# Altium schematic symbol library BARKO_SCHLIB.SchLib: 1064 symbols (part 1 of 11) (continued)
## C-100uF-100V (continued)
CAP ALUM 100UF 20% 100V SMD; Manufacturer: United Chemi-Con; Manufacturer Part Number: EMVY101ARA101MKE0S; Dielectric Material: Aluminium; Ripple Current: 450mA; Impedance: 330mR; Life (Hours): 5000Hour; Supplier 1: Digi-Key; Supplier Part Number 1: 565-2511-1-ND; Stock: 2422; Pricing: 1=1.38, 10=1.092, 50=0.9464, 100=0.819 (USD); RoHS: Yes; Mount: Surface Mount; Min Operating Temperature: -40°C; Max Operating Temperature: 105°C; Packaging: Tape and Reel; Ripple Current (AC): 450mA; ESR (Equivalent Series Resistance): 330mR; Termination: SMD/SMT; Package Quantity: 200; Capacitance: 100uF; Voltage Rating: 100V; Tolerance: 20%; Diameter: 12.5mm; Length: 0.53inch; Height: 13.5mm; Height - Seated (Max): 0.531inch; Width: 13mm; REACH SVHC: Unknown; Lead Free: Lead Free; ComponentLink1URL: https://datasheet.ciiva.com/98/mvyseries-98706.pdf?src-supplier=Digi-Key; ComponentLink1Description: https://datasheet.ciiva.com/98/mvyseries-98706.pdf?src-supplier=Digi-Key; ComponentLink2URL: https://datasheet.ciiva.com/98/mvyseries-98707.pdf?src-supplier=Digi-Key; ComponentLink2Description: https://datasheet.ciiva.com/98/mvyseries-98707.pdf?src-supplier=Digi-Key; ComponentLink3URL: https://datasheet.ciiva.com/98/mvyseries-98708.pdf?src-supplier=Digi-Key; ComponentLink3Description: https://datasheet.ciiva.com/98/mvyseries-98708.pdf?src-supplier=Digi-Key; ComponentLink4URL: https://datasheet.ciiva.com/7788/1514044-7788445.pdf?src-supplier=Element14; ComponentLink4Description: https://datasheet.ciiva.com/7788/1514044-7788445.pdf?src-supplier=Element14
footprint C-E-12.5x13.5
pins: 1, 2
text: +

## C-100UF-2917
designator C?, comment 100UF  Voltage Rating: 16V  Case/Package: 2917
CAP TANT 100UF 16V 10% 2917; Manufacturer: Kyocera AVX; Manufacturer Part Number: TPSD107K016R0125; Dielectric Material: Tantalum; ESR (Equivalent Series Resistance): 125mR; Ripple Current: 438uA; Leakage Current: 16uA; Polarity: Polar; Dissipation Factor: 6%; Approvals: IEC; .PCBCHK: CHECKED; .Creator: M.OZKAN; Washability: OK; Supplier 1: Digi-Key; Supplier Part Number 1: 478-1778-6-ND; Stock 1: 120362; Pricing 1: 1=1.12, 10=0.888, 100=0.6656 (USD); Mount: PCB,Surface Mount; Case Code (Metric): 7343; Case Code (Imperial): 2917; Min Operating Temperature: -55°C; Max Operating Temperature: 125°C; Capacitance: 100uF; Tolerance: 10%; Packaging: Tape and Reel; Voltage Rating (DC): 16V; Package Quantity: 1; Termination: SMD/SMT; Voltage: 16V; Features: General Purpose; Length: 7.3mm; Height: 2.9mm; Width: 0.169inch; Height - Seated (Max): 0.122inch; Depth: 4.3mm; Lead Pitch: 4.4mm; Radiation Hardening: No; REACH SVHC: No SVHC; Lead Free: Lead Free; ComponentLink1URL: http://www.jameco.com/Jameco/Products/ProdDS/2028533.pdf; ComponentLink1Description: http://www.jameco.com/Jameco/Products/ProdDS/2028533.pdf; ComponentLink2URL: http://www.avx.com/docs/catalogs/tps.pdf; ComponentLink2Description: http://www.avx.com/docs/catalogs/tps.pdf; ComponentLink3URL: http://global.kyocera.com/prdct/electro/pdf/capacitors/taj-ce.pdf; ComponentLink3Description: http://global.kyocera.com/prdct/electro/pdf/capacitors/taj-ce.pdf; ComponentLink4URL: https://www.alliedelec.com/m/d/83cf44e04b230909adf636c7cda0f956.pdf; ComponentLink4Description: https://www.alliedelec.com/m/d/83cf44e04b230909adf636c7cda0f956.pdf; ComponentLink5URL: http://datasheets.avx.com/TPS.pdf; ComponentLink5Description: http://datasheets.avx.com/TPS.pdf; ComponentLink6URL: http://www.mouser.com/ds/2/40/tps-776850.pdf; ComponentLink6Description: http://www.mouser.com/ds/2/40/tps-776850.pdf; ComponentLink7URL: http://www.avxcorp.com/docs/Catalogs/tps.pdf; ComponentLink7Description: http://www.avxcorp.com/docs/Catalogs/tps.pdf; Supplier 2: Digi-Key; Supplier Part Number 2: 718-1102-6-ND; Stock 2: 6782; Pricing 2: 1=1.04, 10=0.822, 100=0.6167 (USD); Number of Pins: 2; Weight: 0.023634oz; ComponentLink8URL: http://www.vishay.com/docs/40005/593d.pdf; ComponentLink8Description: http://www.vishay.com/docs/40005/593d.pdf; ComponentLink9URL: http://documents.rs-components.com/techlib://itc_doclist_GB.htm?stockno=6844477; ComponentLink9Description: http://documents.rs-components.com/techlib://itc_doclist_GB.htm?stockno=6844477; ComponentLink10URL: http://www.mouser.com/ds/2/427/593d-239975.pdf; ComponentLink10Description: http://www.mouser.com/ds/2/427/593d-239975.pdf; ComponentLink11URL: https://www.alliedelec.com/m/d/4999163682384315a74ef22064734d6b.pdf; ComponentLink11Description: https://www.alliedelec.com/m/d/4999163682384315a74ef22064734d6b.pdf; Supplier 3: Digi-Key; Supplier Part Number 3: 478-9140-6-ND; Stock 3: 20252; Pricing 3: 1=1.38, 10=1.087, 100=0.8151 (USD); ComponentLink12URL: https://www.distrelec.biz/Web/Downloads/_e/ng/tps_ENG.pdf?mime=application%2Fpdf; ComponentLink12Description: https://www.distrelec.biz/Web/Downloads/_e/ng/tps_ENG.pdf?mime=application%2Fpdf; ComponentLink13URL: http://uk.rs-online.com/webdocs/0df8/0900766b80df8ba2.pdf; ComponentLink13Description: http://uk.rs-online.com/webdocs/0df8/0900766b80df8ba2.pdf; ComponentLink14URL: http://www.farnell.com/datasheets/1680477.pdf; ComponentLink14Description: http://www.farnell.com/datasheets/1680477.pdf; ComponentLink15URL: http://www.produktinfo.conrad.com/datenblaetter/800000-824999/806604-da-01-en-SMD_TANTAL100UF_16V_10__0_100R_500ST.pdf; ComponentLink15Description: http://www.produktinfo.conrad.com/datenblaetter/800000-824999/806604-da-01-en-SMD_TANTAL100UF_16V_10__0_100R_500ST.pdf; .SCHCHK: CHECKED
footprint C-TANTD-7343
footprint C-TANTD-7343
pins: 1, 2
text: +

## C-100UF-RADIAL TH_1
designator C?, comment 100UF  Voltage Rating: 63V  Case/Package: Radial
CAP ALUM 100UF 63V 20% RADIAL; Manufacturer: Nichicon; Manufacturer Part Number: UVR1J101MPD; Dielectric Material: Aluminium; Ripple Current: 300mA; Leakage Current: 189uA; Life (Hours): 2000Hour; Dissipation Factor: 0.1%; Lead Diameter: 0.6mm; ESR (Equivalent Series Resistance): 460mR; Impedance: 256mR; Polarity: Polar; Lead/Base Style: Straight; .PCBCHK: CHECKED; .Creator: M.OZKAN; Washability: OK; Supplier 1: Digi-Key; Supplier Part Number 1: 493-1124-ND; Stock 1: 22422; Pricing 1: 1=0.38, 10=0.264, 100=0.1581, 500=0.1186, 1000=0.10015, 2500=0.09488, 5000=0.08961 (USD); Mount: PCB,Through Hole; Number of Pins: 2; Min Operating Temperature: -40°C; Max Operating Temperature: 85°C; Capacitance: 100uF; Tolerance: 20%; Package Quantity: 200; Packaging: Bulk; Voltage Rating (DC): 63V; Termination: Radial; Voltage: 63V; Features: General Purpose; Diameter: 10mm; Length: 12.5mm; Height: 12.5mm; Lead Pitch: 5mm; Height - Seated (Max): 0.394inch; Radiation Hardening: No; REACH SVHC: No SVHC; Lead Free: Lead Free; ComponentLink1URL: https://www.verical.com/server-webapp/html/getDatasheet?partID=54724; ComponentLink1Description: https://www.verical.com/server-webapp/html/getDatasheet?partID=54724; ComponentLink2URL: http://www.nichicon.co.jp/english/products/pdfs/e-vr.pdf; ComponentLink2Description: http://www.nichicon.co.jp/english/products/pdfs/e-vr.pdf; ComponentLink3URL: http://nichicon-us.com/english/products/pdfs/e-mi_tape.pdf; ComponentLink3Description: http://nichicon-us.com/english/products/pdfs/e-mi_tape.pdf; ComponentLink4URL: http://products.nichicon.co.jp/en/pdf/XJA043/e-vr.pdf; ComponentLink4Description: http://products.nichicon.co.jp/en/pdf/XJA043/e-vr.pdf; ComponentLink5URL: http://www.alliedelec.com/m/d/2079ee50b23aa24d1fe62a3e164465c7.pdf; ComponentLink5Description: http://www.alliedelec.com/m/d/2079ee50b23aa24d1fe62a3e164465c7.pdf; ComponentLink6URL: http://www.mouser.com/ds/2/293/e-uvz-880014.pdf; ComponentLink6Description: http://www.mouser.com/ds/2/293/e-uvz-880014.pdf; ComponentLink7URL: http://www.nichicon.co.jp/english/products/pdfs/e-vz.pdf; ComponentLink7Description: http://www.nichicon.co.jp/english/products/pdfs/e-vz.pdf; ComponentLink8URL: http://www.alliedelec.com/m/d/825fa8fc1ff7f2c7f22f565ab2398abe.pdf; ComponentLink8Description: http://www.alliedelec.com/m/d/825fa8fc1ff7f2c7f22f565ab2398abe.pdf; ComponentLink9URL: http://nichicon-us.com/english/products/pdfs/e-uvz.pdf; ComponentLink9Description: http://nichicon-us.com/english/products/pdfs/e-uvz.pdf; Supplier 2: Digi-Key; Supplier Part Number 2: 493-1936-ND; Stock 2: 17120; Pricing 2: 1=0.45, 10=0.317, 100=0.2085, 500=0.15442, 1000=0.13125, 2500=0.12353, 5000=0.11581 (USD); ComponentLink10URL: http://www.mouser.com/ds/2/293/e-upw-883815.pdf; ComponentLink10Description: http://www.mouser.com/ds/2/293/e-upw-883815.pdf; ComponentLink11URL: http://www.nichicon.co.jp/english/products/pdfs/e-pw.pdf; ComponentLink11Description: http://www.nichicon.co.jp/english/products/pdfs/e-pw.pdf; ComponentLink12URL: http://uk.rs-online.com/webdocs/0ec9/0900766b80ec9186.pdf; ComponentLink12Description: http://uk.rs-online.com/webdocs/0ec9/0900766b80ec9186.pdf; ComponentLink13URL: http://www.alliedelec.com/m/d/6537666b9e71158eceac60ee1d77586f.pdf; ComponentLink13Description: http://www.alliedelec.com/m/d/6537666b9e71158eceac60ee1d77586f.pdf; ComponentLink14URL: https://www.verical.com/server-webapp/html/getDatasheet?partID=497226; ComponentLink14Description: https://www.verical.com/server-webapp/html/getDatasheet?partID=497226; ComponentLink15URL: http://www.produktinfo.conrad.com/datenblaetter/425000-449999/444542-da-01-en-RADIAL_ELKO_PW_100UF_63_V.pdf; ComponentLink15Description: http://www.produktinfo.conrad.com/datenblaetter/425000-449999/444542-da-01-en-RADIAL_ELKO_PW_100UF_63_V.pdf; Supplier 3: Digi-Key; Supplier Part Number 3: 718-2234-ND; Stock 3: 580; Pricing 3: 1=0.76, 10=0.538, 100=0.3544, 500=0.2625, 1000=0.22313, 2500=0.21, 5000=0.19688 (USD); ComponentLink16URL: http://www.farnell.com/datasheets/716566.pdf; ComponentLink16Description: http://www.farnell.com/datasheets/716566.pdf; .SCHCHK: CHECKED
pins: 1, 2
text: +

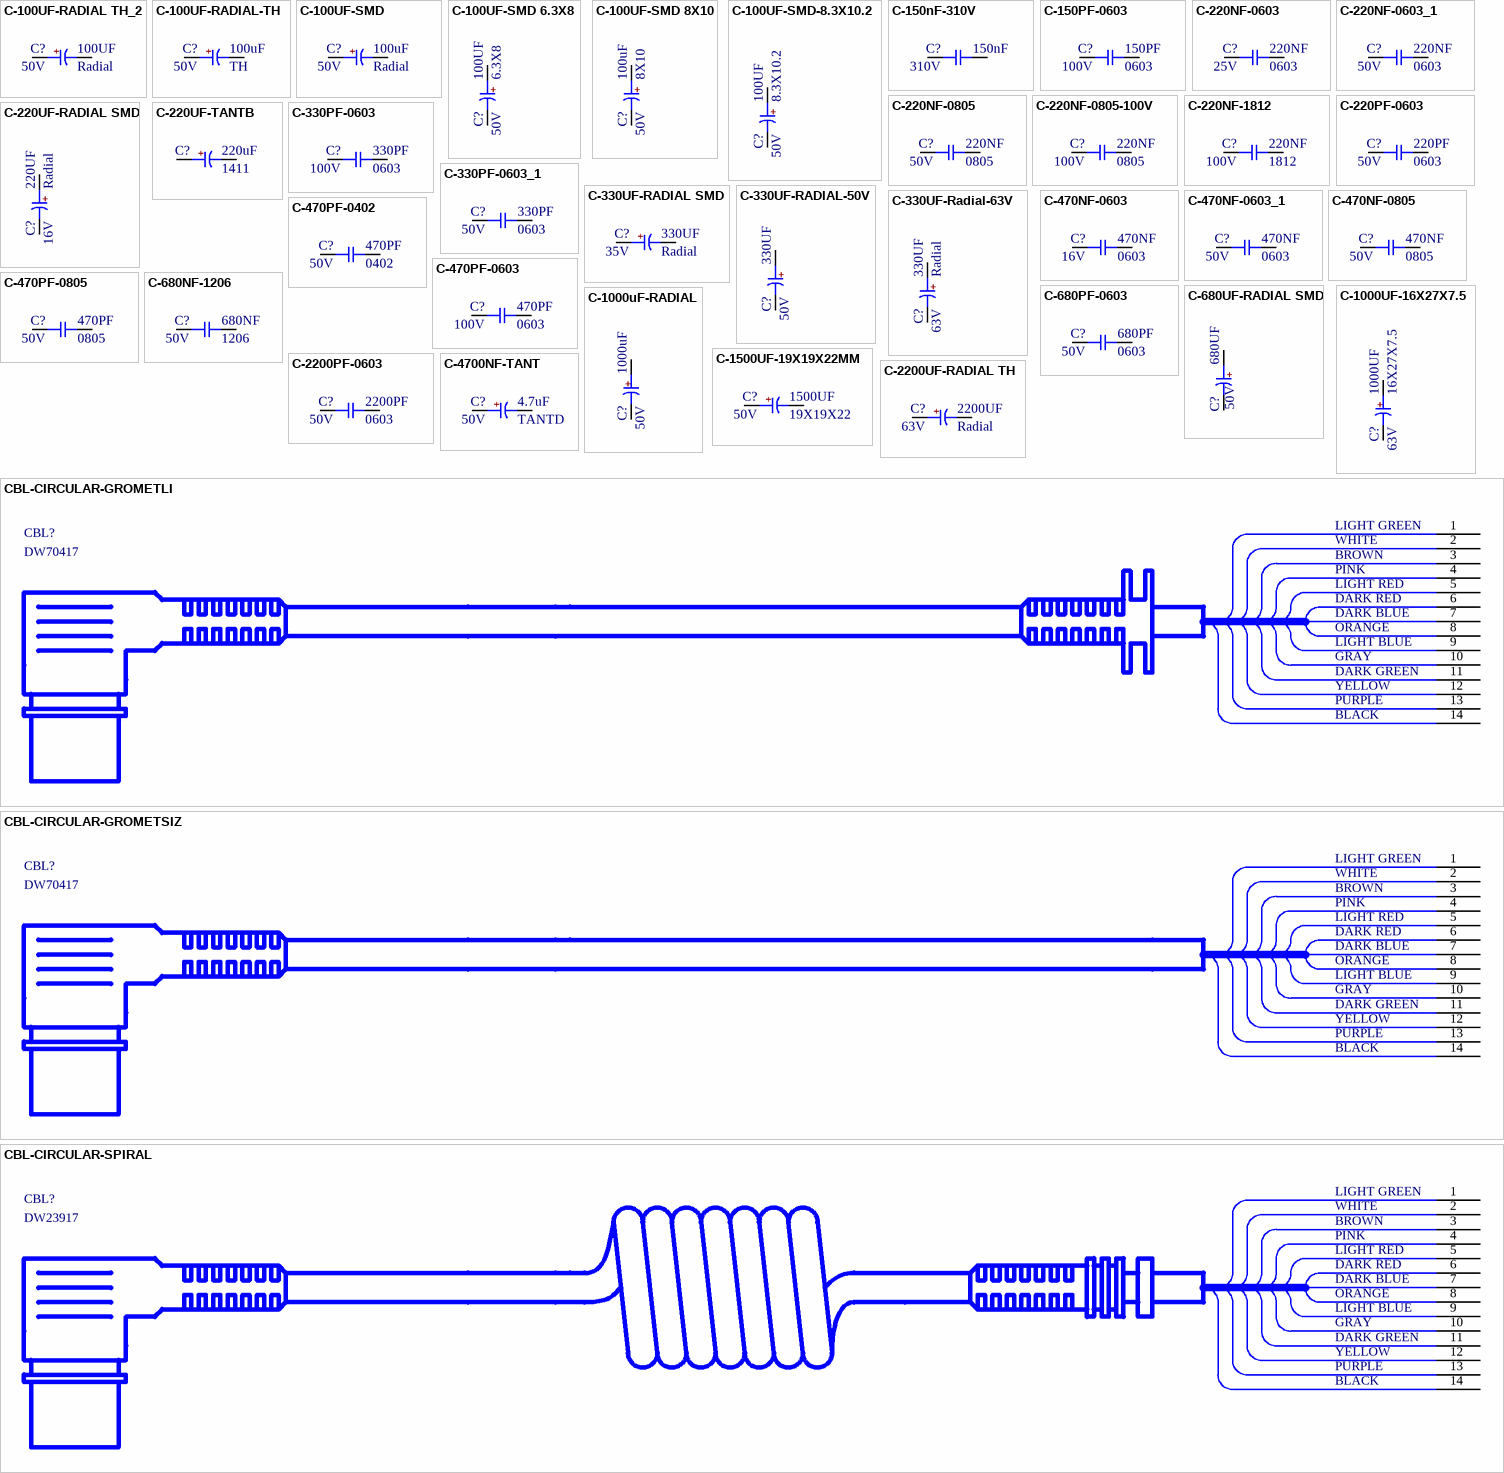
[diagram p3: symbols C-100UF-RADIAL TH_2 to CBL-CIRCULAR-SPIRAL]

## C-100UF-RADIAL TH_2
designator C?, comment 100UF  Voltage Rating: 50V  Case/Package: Radial
CAP ALUM 100UF 20% 50V RADIAL; Manufacturer: Panasonic; Manufacturer Part Number: EEU-FM1H101B; Ripple Current: 870mA; Impedance: 61mR; Life (Hours): 3000Hour; Polarity: Polar; Dissipation Factor: 0.1%; Lead/Base Style: Straight; Lead Diameter: 0.6mm; Dielectric Material: Aluminium; Leakage Current: 150uA; .PCBCHK: CHECKED; .Creator: M.OZKAN; Washability: OK; Supplier 1: Digi-Key; Supplier Part Number 1: P19712CT-ND; Stock 1: 7813; Pricing 1: 1=0.51, 10=0.356, 100=0.2137, 500=0.1603 (USD); Mount: PCB,Through Hole; Min Operating Temperature: -40°C; Max Operating Temperature: 105°C; Capacitance: 100uF; Tolerance: 20%; Packaging: Tape and Reel; Package Quantity: 1000; Voltage Rating (DC): 50V; ESR (Equivalent Series Resistance): 61mR; Termination: Radial; Diameter: 8mm; Length: 11.5mm; Height: 11.5mm; Lead Pitch: 5mm; Height - Seated (Max): 0.512inch; Radiation Hardening: No; REACH SVHC: No SVHC; Lead Free: Lead Free; ComponentLink1URL: https://www.alliedelec.com/m/d/fdd897f5b67d9afc9e8599215884f1a0.pdf; ComponentLink1Description: https://www.alliedelec.com/m/d/fdd897f5b67d9afc9e8599215884f1a0.pdf; ComponentLink2URL: http://www.farnell.com/datasheets/1971458.pdf; ComponentLink2Description: http://www.farnell.com/datasheets/1971458.pdf; ComponentLink3URL: http://www.farnell.com/datasheets/1678946.pdf; ComponentLink3Description: http://www.farnell.com/datasheets/1678946.pdf; ComponentLink4URL: http://industrial.panasonic.com/www-data/pdf/ABA0000/ABA0000CE108.pdf; ComponentLink4Description: http://industrial.panasonic.com/www-data/pdf/ABA0000/ABA0000CE108.pdf; Supplier 2: Digi-Key; Supplier Part Number 2: P19713TB-ND; Stock 2: 1000; Pricing 2: 1000=0.11771, 2000=0.11151, 5000=0.10532, 10000=0.09912, 25000=0.09293, 50000=0.08673, 100000=0.08054 (USD); Features: General Purpose; Supplier 3: Digi-Key; Supplier Part Number 3: 493-13464-1-ND; Stock 3: 54331; Pricing 3: 1=0.36, 10=0.251, 100=0.1507, 500=0.11302 (USD); Number of Pins: 2; ComponentLink5URL: http://nichicon-us.com/english/products/pdfs/e-mi_tape.pdf; ComponentLink5Description: http://nichicon-us.com/english/products/pdfs/e-mi_tape.pdf; ComponentLink6URL: http://www.alliedelec.com/m/d/825fa8fc1ff7f2c7f22f565ab2398abe.pdf; ComponentLink6Description: http://www.alliedelec.com/m/d/825fa8fc1ff7f2c7f22f565ab2398abe.pdf; ComponentLink7URL: http://www.farnell.com/datasheets/1909357.pdf; ComponentLink7Description: http://www.farnell.com/datasheets/1909357.pdf; ComponentLink8URL: http://nichicon-us.com/english/products/pdfs/e-vz.pdf; ComponentLink8Description: http://nichicon-us.com/english/products/pdfs/e-vz.pdf; Voltage: 50V; .SCHCHK: CHECKED
footprint THT_8x13x3.5
pins: 1, 2
text: +

## C-100UF-RADIAL-TH
designator C?, comment Voltage Rating (DC): 50V  Mount: TH  (hidden comment: 100UF)
CAP ALUM 100UF 20% 50V RADIAL; Manufacturer: Nichicon; Manufacturer Part Number: UVR1H101MPD1TA; Dielectric Material: Aluminium; Ripple Current: 260mA; Leakage Current: 150uA; Life (Hours): 2000Hour; Dissipation Factor: 0.12%; Lead Diameter: 0.6mm; .PCBCHK: CHECKED; .Creator: M.OZKAN; Washability: OK; Supplier 1: Digi-Key; Stock 1: 12000; Pricing 1: 1000=0.07519, 2000=0.07161, 5000=0.06624, 10000=0.06266, 25000=0.05729, 50000=0.05371, 100000=0.04744 (USD); Case/Package: Radial; Number of Pins: 2; Min Operating Temperature: -40°C; Max Operating Temperature: 85°C; Package Quantity: 1000; Voltage Rating: 50V; Tolerance: 20%; Packaging: Tape and Reel; Termination: Radial; Diameter: 8mm; Length: 11.5mm; Height: 11.5mm; Lead Pitch: 5mm; Height - Seated (Max): 0.453inch; Radiation Hardening: No; REACH SVHC: No SVHC; Lead Free: Lead Free; ComponentLink1URL: http://nichicon-us.com/english/products/pdfs/e-mi_tape.pdf; ComponentLink1Description: http://nichicon-us.com/english/products/pdfs/e-mi_tape.pdf; ComponentLink2URL: https://www.verical.com/server-webapp/html/getDatasheet?partID=54730; ComponentLink2Description: https://www.verical.com/server-webapp/html/getDatasheet?partID=54730; ComponentLink3URL: http://products.nichicon.co.jp/en/pdf/XJA043/e-vr.pdf; ComponentLink3Description: http://products.nichicon.co.jp/en/pdf/XJA043/e-vr.pdf; Supplier Part Number 1: UVR1H101MPD1TA-ND; Supplier 2: Digi-Key; Supplier Part Number 2: 515D107M050BB6AE3-ND; .SCHCHK: CHECKED; Capacitance: 100uF
footprint C-RADİAL-8X11.5X5
pins: 1, 2
text: +

## C-100UF-SMD
designator C?, comment Case/Package: Radial  Voltage Rating (DC): 50V  (hidden comment: 100UF)
CAP ALUM 100UF 20% 50V SMD; Manufacturer: Nichicon; Manufacturer Part Number: UUD1H101MNL1GS; Dielectric Material: Aluminium; Ripple Current: 300mA; Life (Hours): 5000Hour; Impedance: 340mR; Leakage Current: 3uA; Dissipation Factor: 0.14%; Lead Diameter: 1.1mm; .PCBCHK: CHECKED; .Creator: M.OZKAN; Washability: OK; Supplier 1: Digi-Key; Stock 1: 72155; Pricing 1: 1=0.75, 10=0.554, 100=0.3796 (USD); Number of Pins: 2; Min Operating Temperature: -55°C; Max Operating Temperature: 105°C; Tolerance: 20%; Ripple Current (AC): 300mA; Package Quantity: 500; Packaging: Tape and Reel; Voltage Rating: 50V; Termination: SMD/SMT; Voltage: 50V; Diameter: 8mm; Length: 10mm; Height: 10mm; Lead Pitch: 3.1mm; Height - Seated (Max): 0.394inch; Radiation Hardening: No; REACH SVHC: No SVHC; Lead Free: Lead Free; ComponentLink1URL: http://www.farnell.com/datasheets/2100017.pdf; ComponentLink1Description: http://www.farnell.com/datasheets/2100017.pdf; ComponentLink2URL: http://nichicon-us.com/english/products/pdfs/e-uud.pdf; ComponentLink2Description: http://nichicon-us.com/english/products/pdfs/e-uud.pdf; ComponentLink3URL: http://www.nichicon.co.jp/english/products/pdfs/e-ch_ref.pdf; ComponentLink3Description: http://www.nichicon.co.jp/english/products/pdfs/e-ch_ref.pdf; ComponentLink4URL: http://nichicon-us.com/english/products/pdfs/e-ud.pdf; ComponentLink4Description: http://nichicon-us.com/english/products/pdfs/e-ud.pdf; ComponentLink5URL: http://www.farnell.com/datasheets/1910936.pdf; ComponentLink5Description: http://www.farnell.com/datasheets/1910936.pdf; ComponentLink6URL: http://www.farnell.com/datasheets/66055.pdf; ComponentLink6Description: http://www.farnell.com/datasheets/66055.pdf; ComponentLink7URL: http://uk.rs-online.com/webdocs/0fa3/0900766b80fa39e7.pdf; ComponentLink7Description: http://uk.rs-online.com/webdocs/0fa3/0900766b80fa39e7.pdf; ComponentLink8URL: http://www.nichicon.co.jp/english/products/pdfs/e-ud.pdf; ComponentLink8Description: http://www.nichicon.co.jp/english/products/pdfs/e-ud.pdf; Supplier Part Number 1: 493-2306-6-ND; Supplier 2: Digi-Key; Supplier Part Number 2: 565-2495-6-ND; .SCHCHK: CHECKED; Capacitance: 100uF
pins: 1, 2
text: +

## C-100UF-SMD 6.3X8
designator C?, comment 100UF  Case/Package: 6.3X8  Voltage Rating: 50V
CAP ALUM 100UF 20% 50V SMD; Manufacturer: Panasonic; Manufacturer Part Number: EEE-FTH101XAP; Ripple Current (AC): 350mA; ESR (Equivalent Series Resistance): 340mR; Life (Hours): 2000Hour; Leakage Current: 50uA; Lead Diameter: 0.65mm; Dielectric Material: Aluminium; Dissipation Factor: 0.14%; Polarity: Polar; .PCBCHK: CHECKED; .Creator: M.OZKAN; Washability: OK; Supplier 1: Digi-Key; Supplier Part Number 1: PCE5024DKR-ND; Stock 1: 119228; Pricing 1: 1=0.8, 10=0.591, 100=0.4051 (USD); Mount: PCB,Surface Mount; Number of Pins: 2; Contact Plating: Tin; Min Operating Temperature: -55°C; Max Operating Temperature: 105°C; Packaging: Tape and Reel; Capacitance: 100uF; Tolerance: 20%; Ripple Current: 350mA; Package Quantity: 1; Voltage Rating (DC): 50V; Termination: SMD/SMT; Voltage: 50V; Diameter: 6.3mm; Length: 7.7mm; Height: 7.7mm; Lead Pitch: 1.8mm; Height - Seated (Max): 0.315inch; Radiation Hardening: No; REACH SVHC: No SVHC; ComponentLink1URL: http://uk.rs-online.com/webdocs/0f49/0900766b80f4973e.pdf; ComponentLink1Description: http://uk.rs-online.com/webdocs/0f49/0900766b80f4973e.pdf; ComponentLink2URL: https://www.distrelec.biz/Web/Downloads/_t/ds/smd_ft_eng_tds.pdf?mime=application%2Fpdf; ComponentLink2Description: https://www.distrelec.biz/Web/Downloads/_t/ds/smd_ft_eng_tds.pdf?mime=application%2Fpdf; ComponentLink3URL: http://www.farnell.com/datasheets/1244238.pdf; ComponentLink3Description: http://www.farnell.com/datasheets/1244238.pdf; ComponentLink4URL: http://www.farnell.com/datasheets/1898066.pdf; ComponentLink4Description: http://www.farnell.com/datasheets/1898066.pdf; ComponentLink5URL: http://www.farnell.com/datasheets/1790597.pdf; ComponentLink5Description: http://www.farnell.com/datasheets/1790597.pdf; ComponentLink6URL: http://www.mouser.com/ds/2/315/ABA0000C573-947481.pdf; ComponentLink6Description: http://www.mouser.com/ds/2/315/ABA0000C573-947481.pdf; ComponentLink7URL: http://industrial.panasonic.com/www-data/pdf/ABA0000/ABA0000CE135.pdf; ComponentLink7Description: http://industrial.panasonic.com/www-data/pdf/ABA0000/ABA0000CE135.pdf; Impedance: 340mR; Lead Free: Lead Free; ComponentLink8URL: http://www.farnell.com/datasheets/2100017.pdf; ComponentLink8Description: http://www.farnell.com/datasheets/2100017.pdf; ComponentLink9URL: http://nichicon-us.com/english/products/pdfs/e-uud.pdf; ComponentLink9Description: http://nichicon-us.com/english/products/pdfs/e-uud.pdf; ComponentLink10URL: http://www.nichicon.co.jp/english/products/pdfs/e-ch_ref.pdf; ComponentLink10Description: http://www.nichicon.co.jp/english/products/pdfs/e-ch_ref.pdf; ComponentLink11URL: http://nichicon-us.com/english/products/pdfs/e-ud.pdf; ComponentLink11Description: http://nichicon-us.com/english/products/pdfs/e-ud.pdf; ComponentLink12URL: http://www.farnell.com/datasheets/1910936.pdf; ComponentLink12Description: http://www.farnell.com/datasheets/1910936.pdf; ComponentLink13URL: http://www.farnell.com/datasheets/66055.pdf; ComponentLink13Description: http://www.farnell.com/datasheets/66055.pdf; ComponentLink14URL: http://uk.rs-online.com/webdocs/0fa3/0900766b80fa39e7.pdf; ComponentLink14Description: http://uk.rs-online.com/webdocs/0fa3/0900766b80fa39e7.pdf; ComponentLink15URL: http://www.nichicon.co.jp/english/products/pdfs/e-ud.pdf; ComponentLink15Description: http://www.nichicon.co.jp/english/products/pdfs/e-ud.pdf; Supplier 2: Digi-Key; Supplier Part Number 2: 565-4324-6-ND; Stock 2: 3225; Pricing 2: 1=0.81, 10=0.599, 100=0.4108 (USD); .SCHCHK: CHECKED
footprint C-E-6.6x6.6x8 (Aluminum Electrolytic Capacitor, Body 6,60x6,60x8,00mm, IPC Low Density)
pins: 1, 2
text: +

## C-100UF-SMD 8X10
designator C?, comment Case/Package: 8X10  Voltage Rating (DC): 50V  (hidden comment: 100UF)
CAP ALUM 100UF 20% 50V SMD; Manufacturer: Nichicon; Manufacturer Part Number: UUD1H101MNL1GS; Dielectric Material: Aluminium; Ripple Current: 300mA; Life (Hours): 5000Hour; Impedance: 340mR; Leakage Current: 3uA; Dissipation Factor: 0.14%; Lead Diameter: 1.1mm; .PCBCHK: CHECKED; .Creator: M.OZKAN; Washability: OK; Supplier 1: Digi-Key; Stock 1: 72155; Pricing 1: 1=0.75, 10=0.554, 100=0.3796 (USD); Number of Pins: 2; Min Operating Temperature: -55°C; Max Operating Temperature: 105°C; Tolerance: 20%; Ripple Current (AC): 300mA; Package Quantity: 500; Packaging: Tape and Reel; Voltage Rating: 50V; Termination: SMD/SMT; Voltage: 50V; Diameter: 8mm; Length: 10mm; Height: 10mm; Lead Pitch: 3.1mm; Height - Seated (Max): 0.394inch; Radiation Hardening: No; REACH SVHC: No SVHC; Lead Free: Lead Free; ComponentLink1URL: http://www.farnell.com/datasheets/2100017.pdf; ComponentLink1Description: http://www.farnell.com/datasheets/2100017.pdf; ComponentLink2URL: http://nichicon-us.com/english/products/pdfs/e-uud.pdf; ComponentLink2Description: http://nichicon-us.com/english/products/pdfs/e-uud.pdf; ComponentLink3URL: http://www.nichicon.co.jp/english/products/pdfs/e-ch_ref.pdf; ComponentLink3Description: http://www.nichicon.co.jp/english/products/pdfs/e-ch_ref.pdf; ComponentLink4URL: http://nichicon-us.com/english/products/pdfs/e-ud.pdf; ComponentLink4Description: http://nichicon-us.com/english/products/pdfs/e-ud.pdf; ComponentLink5URL: http://www.farnell.com/datasheets/1910936.pdf; ComponentLink5Description: http://www.farnell.com/datasheets/1910936.pdf; ComponentLink6URL: http://www.farnell.com/datasheets/66055.pdf; ComponentLink6Description: http://www.farnell.com/datasheets/66055.pdf; ComponentLink7URL: http://uk.rs-online.com/webdocs/0fa3/0900766b80fa39e7.pdf; ComponentLink7Description: http://uk.rs-online.com/webdocs/0fa3/0900766b80fa39e7.pdf; ComponentLink8URL: http://www.nichicon.co.jp/english/products/pdfs/e-ud.pdf; ComponentLink8Description: http://www.nichicon.co.jp/english/products/pdfs/e-ud.pdf; Supplier Part Number 1: 493-2306-6-ND; Supplier 2: Digi-Key; Supplier Part Number 2: 565-2495-6-ND; .SCHCHK: CHECKED; Capacitance: 100uF
pins: 1, 2
text: +

## C-100UF-SMD-8.3X10.2
designator C?, comment 100UF  Voltage Rating: 50V  Case/Package: 8.3X10.2
CAP ALUM 100UF 20% 50V SMD; Manufacturer: Panasonic; Manufacturer Part Number: EEE1HA101UP; Ripple Current: 200mA; Life (Hours): 2000Hour; Dielectric Material: Aluminium; Impedance: 340mR; Leakage Current: 3uA; Dissipation Factor: 0.14%; Lead Diameter: 1.1mm; .Creator: M.OZKAN; .PCBCHK: USED; Washability: OK; Supplier 1: Digi-Key; Supplier Part Number 1: PCE3917DKR-ND; Stock 1: 353681; Pricing 1: 1=0.64, 10=0.454, 100=0.2987 (USD); Mount: PCB,Surface Mount; Contact Plating: Tin; Min Operating Temperature: -40°C; Max Operating Temperature: 85°C; Capacitance: 100uF; Tolerance: 20%; Ripple Current (AC): 200mA; Packaging: Tape and Reel; Voltage Rating (DC): 50V; Package Quantity: 1; Termination: SMD/SMT; Diameter: 8mm; Length: 10.5mm; Height: 10.2mm; Height - Seated (Max): 0.402inch; Radiation Hardening: No; REACH SVHC: Unknown; Lead Free: Lead Free; ComponentLink1URL: http://industrial.panasonic.com/www-data/pdf/ABA0000/ABA0000CE2.pdf?src-supplier=Avnet; ComponentLink1Description: http://industrial.panasonic.com/www-data/pdf/ABA0000/ABA0000CE2.pdf?src-supplier=Avnet; ComponentLink2URL: http://www.jameco.com/Jameco/Products/ProdDS/1356308.pdf?src-supplier=Jameco; ComponentLink2Description: http://www.jameco.com/Jameco/Products/ProdDS/1356308.pdf?src-supplier=Jameco; ComponentLink3URL: https://www.verical.com/server-webapp/html/getDatasheet?partID=111566&src-supplier=Verical; ComponentLink3Description: https://www.verical.com/server-webapp/html/getDatasheet?partID=111566&src-supplier=Verical; ComponentLink4URL: http://industrial.panasonic.com/www-data/pdf/ABA0000/ABA0000CE2.pdf?src-supplier=Avnet+Europe; ComponentLink4Description: http://industrial.panasonic.com/www-data/pdf/ABA0000/ABA0000CE2.pdf?src-supplier=Avnet+Europe; ComponentLink5URL: https://www.alliedelec.com/m/d/310b2cfd0553a89b5ffae819c6e32d0a.pdf?src-supplier=Allied+Electronics; ComponentLink5Description: https://www.alliedelec.com/m/d/310b2cfd0553a89b5ffae819c6e32d0a.pdf?src-supplier=Allied+Electronics; ComponentLink6URL: http://industrial.panasonic.com/www-data/pdf/ABA0000/ABA0000CE2.pdf?src-supplier=Future+Electronics; ComponentLink6Description: http://industrial.panasonic.com/www-data/pdf/ABA0000/ABA0000CE2.pdf?src-supplier=Future+Electronics; ComponentLink7URL: http://www.mouser.com/ds/2/315/ABA0000CE2-40801.pdf?src-supplier=Mouser; ComponentLink7Description: http://www.mouser.com/ds/2/315/ABA0000CE2-40801.pdf?src-supplier=Mouser; Supplier 2: Digi-Key; Supplier Part Number 2: 493-2306-6-ND; Stock 2: 69145; Pricing 2: 1=0.72, 10=0.527, 100=0.3616 (USD); Number of Pins: 2; Voltage: 50V; Lead Pitch: 3.1mm; ComponentLink8URL: http://www.farnell.com/datasheets/2100017.pdf?src-supplier=Farnell; ComponentLink8Description: http://www.farnell.com/datasheets/2100017.pdf?src-supplier=Farnell; ComponentLink9URL: http://nichicon-us.com/english/products/pdfs/e-uud.pdf?src-supplier=Digi-Key; ComponentLink9Description: http://nichicon-us.com/english/products/pdfs/e-uud.pdf?src-supplier=Digi-Key; ComponentLink10URL: http://www.nichicon.co.jp/english/products/pdfs/e-ch_ref.pdf?src-supplier=Digi-Key; ComponentLink10Description: http://www.nichicon.co.jp/english/products/pdfs/e-ch_ref.pdf?src-supplier=Digi-Key; ComponentLink11URL: http://nichicon-us.com/english/products/pdfs/e-ud.pdf?src-supplier=Element14; ComponentLink11Description: http://nichicon-us.com/english/products/pdfs/e-ud.pdf?src-supplier=Element14; ComponentLink12URL: http://www.farnell.com/datasheets/1910936.pdf?src-supplier=Element14; ComponentLink12Description: http://www.farnell.com/datasheets/1910936.pdf?src-supplier=Element14; ComponentLink13URL: http://nichicon-us.com/english/products/pdfs/e-ud.pdf?src-supplier=Mouser; ComponentLink13Description: http://nichicon-us.com/english/products/pdfs/e-ud.pdf?src-supplier=Mouser; ComponentLink14URL: http://www.farnell.com/datasheets/66055.pdf?src-supplier=Element14; ComponentLink14Description: http://www.farnell.com/datasheets/66055.pdf?src-supplier=Element14; ComponentLink15URL: http://uk.rs-online.com/webdocs/0fa3/0900766b80fa39e7.pdf?src-supplier=RSComponents; ComponentLink15Description: http://uk.rs-online.com/webdocs/0fa3/0900766b80fa39e7.pdf?src-supplier=RSComponents; ComponentLink16URL: http://www.nichicon.co.jp/english/products/pdfs/e-ud.pdf?src-supplier=Avnet+Europe; ComponentLink16Description: http://www.nichicon.co.jp/english/products/pdfs/e-ud.pdf?src-supplier=Avnet+Europe; .SCHCHK: USED
footprint C-E-8.3x8.3x10.2
pins: 1, 2
text: +

## C-150nF-310V
designator C?, comment 150nF  Voltage Rating (AC): 310V
CAP FILM 0.15UF 10% 310VAC RAD; Manufacturer: Wurth Electronics; Manufacturer Part Number: 890334023025CS; Dielectric Material: PP; Supplier 1: Digi-Key; Supplier Part Number 1: 732-5735-ND; Stock: 1715; Pricing: 1=0.45, 50=0.345, 100=0.308, 250=0.283, 500=0.246, 1000=0.228 (USD); RoHS: Yes; Mount: Through Hole; Case/Package: Radial; Min Operating Temperature: -40°C; Max Operating Temperature: 105°C; Packaging: Bulk; Dielectric: PP; Termination: PC Pins; Capacitance: 150nF; Tolerance: 10%; Length: 0.512inch; Width: 0.276inch; Height - Seated (Max): 0.492inch; Lead Pitch: 0.394inch; REACH SVHC: Unknown; ComponentLink1URL: http://www.farnell.com/datasheets/1854425.pdf?src-supplier=Farnell; ComponentLink1Description: http://www.farnell.com/datasheets/1854425.pdf?src-supplier=Farnell; ComponentLink2URL: http://www.farnell.com/datasheets/1854425.pdf?src-supplier=Element14; ComponentLink2Description: http://www.farnell.com/datasheets/1854425.pdf?src-supplier=Element14
footprint C-FTXX_L13W7H12 (Film Capacitors, 13x7x12mm)
pins: 1, 2

## C-150PF-0603
designator C?, comment 150PF  Case/Package: 0603  Voltage Rating: 100V
CAP CER 150PF 100V C0G/NP0 0603; Manufacturer: KEMET; Manufacturer Part Number: C0603C151J1GACTU; Dielectric Material: Ceramic; Dielectric: C0G; Tolerance: 5%; Temperature Coefficient: 30ppm/°C; Washability: OK; .Creator: M.OZKAN; .PCBCHK: USED; Supplier 1: Digi-Key; Stock 1: 40687; Pricing: 1=0.10000, 10=0.07000, 100=0.03100, 500=0.02214, 1000=0.01739 (USD); RoHS: Yes; Mount: Surface Mount; Number of Pins: 2; Case Code (Metric): 1608; Case Code (Imperial): 0603; Min Operating Temperature: -55°C; Max Operating Temperature: 125°C; Capacitance: 150pF; Packaging: Tape and Reel; Voltage Rating (DC): 100V; Termination: SMD/SMT; Package Quantity: 4000; Length: 1.6mm; Height: 0.8mm; Width: 0.031inch; Depth: 0.8mm; Thickness: 0.034inch; Lead Pitch: 0.7mm; Radiation Hardening: No; Lead Free: Lead Free; REACH SVHC: No SVHC; ComponentLink1URL: https://datasheet.ciiva.com/5421/kem-c1003-c0g-smd-5421417.pdf?src-supplier=Mouser; ComponentLink1Description: https://datasheet.ciiva.com/5421/kem-c1003-c0g-smd-5421417.pdf?src-supplier=Mouser; ComponentLink2URL: https://datasheet.ciiva.com/7823/40889-7823630.pdf?src-supplier=Element14; ComponentLink2Description: https://datasheet.ciiva.com/7823/40889-7823630.pdf?src-supplier=Element14; Supplier Part Number 1: 399-9007-1-ND; .SCHCHK: USED
footprint C-0603
pins: 1, 2

## C-220NF-0603
designator C?, comment 220NF  Voltage Rating: 25V  Case/Package: 0603
CAP CER 0.22UF 25V X5R 0603; Manufacturer: Kyocera AVX; Manufacturer Part Number: 06033D224KAT2A; Tolerance: 10%; .PCBCHK: USED; .Creator: F:TALI; Washability: OK; Mount: PCB,Surface Mount; Number of Pins: 2; Case Code (Metric): 1608; Case Code (Imperial): 0603; Contact Plating: Matte,Tin; Min Operating Temperature: -55°C; Max Operating Temperature: 85°C; Package Quantity: 1; Capacitance: 220nF; Packaging: Tape and Reel; Voltage Rating (DC): 25V; Dielectric: X5R; Termination: SMD/SMT; Voltage: 25V; Length: 1.6mm; Height: 0.9mm; Width: 0.032inch; Thickness: 0.035inch; Depth: 0.81mm; Radiation Hardening: No; REACH SVHC: No SVHC; Lead Free: Lead Free; ComponentLink1URL: http://datasheets.avx.com/cx5r.pdf; ComponentLink1Description: http://datasheets.avx.com/cx5r.pdf; ComponentLink2URL: http://catalogs.avx.com/SurfaceMount.pdf; ComponentLink2Description: http://catalogs.avx.com/SurfaceMount.pdf; ComponentLink3URL: http://uk.rs-online.com/webdocs/0def/0900766b80def1a5.pdf; ComponentLink3Description: http://uk.rs-online.com/webdocs/0def/0900766b80def1a5.pdf; ComponentLink4URL: https://www.avx.com/docs/catalogs/cx5r.pdf; ComponentLink4Description: https://www.avx.com/docs/catalogs/cx5r.pdf; ComponentLink5URL: http://www.avx.com/docs/Catalogs/cpack.pdf; ComponentLink5Description: http://www.avx.com/docs/Catalogs/cpack.pdf; ComponentLink6URL: https://www.alliedelec.com/m/d/a52e10b462cd2948cc4188268ca2ae21.pdf; ComponentLink6Description: https://www.alliedelec.com/m/d/a52e10b462cd2948cc4188268ca2ae21.pdf; ComponentLink7URL: http://www.farnell.com/datasheets/84508.pdf; ComponentLink7Description: http://www.farnell.com/datasheets/84508.pdf; ComponentLink8URL: http://www.farnell.com/datasheets/1666675.pdf; ComponentLink8Description: http://www.farnell.com/datasheets/1666675.pdf; Ratings: AEC-Q200; Supplier 1: Digi-Key; Supplier Part Number 1: 587-3474-1-ND; Stock 1: 4000; Pricing 1: 1=0.13, 10=0.092, 100=0.0432, 500=0.0303, 1000=0.02509 (USD); Halogen Free: Halogen Free; ComponentLink9URL: http://www.yuden.co.jp/productdata/catalog/en/mlcc01_hq_e.pdf; ComponentLink9Description: http://www.yuden.co.jp/productdata/catalog/en/mlcc01_hq_e.pdf; .SCHCHK: USED
footprint C-0603
pins: 1, 2

## C-220NF-0603_1
designator C?, comment 220NF  Voltage Rating: 50V  Case Code (Imperial): 0603
CAP CER 0.22UF 50V X7R 0603; Manufacturer: Murata; Manufacturer Part Number: GCM188R71H224KA64J; Tolerance: 10%; .PCBCHK: USED; .Creator: F:TALI; Washability: OK; Mount: Surface Mount; Case/Package: 0603; Weight: 0.000222oz; Case Code (Metric): 1608; Min Operating Temperature: -55°C; Max Operating Temperature: 125°C; Capacitance: 220nF; Packaging: Tape and Reel; Dielectric: X7R; Termination: SMD/SMT; Voltage Rating (DC): 50V; Package Quantity: 10000; Length: 0.063inch; Height: 0.8mm; Width: 0.8mm; Thickness: 0.035inch; Ratings: AEC-Q200; Lead Free: Lead Free; Supplier 1: Digi-Key; Supplier Part Number 1: 490-12546-6-ND; Stock 1: 40000; Pricing 1: 1=0.29, 10=0.201, 100=0.1016, 500=0.06952, 1000=0.0615 (USD); Composition: Ceramic; Depth: 0.8mm; REACH SVHC: No SVHC; ComponentLink1URL: http://www.farnell.com/datasheets/1735392.pdf; ComponentLink1Description: http://www.farnell.com/datasheets/1735392.pdf; ComponentLink2URL: http://product.tdk.com/capacitor/mlcc/en/documents/mlccspec_automotive_general_midvoltage_en.pdf; ComponentLink2Description: http://product.tdk.com/capacitor/mlcc/en/documents/mlccspec_automotive_general_midvoltage_en.pdf; ComponentLink3URL: http://www.farnell.com/datasheets/1807242.pdf; ComponentLink3Description: http://www.farnell.com/datasheets/1807242.pdf; ComponentLink4URL: http://www.mouser.com/ds/2/400/lcc_automotive_general_en-843974.pdf; ComponentLink4Description: http://www.mouser.com/ds/2/400/lcc_automotive_general_en-843974.pdf; Voltage: 50V; .SCHCHK: USED
footprint C-0603
pins: 1, 2

## C-220NF-0805
designator C?, comment 220NF  Case/Package: 0805  Voltage Rating: 50V
CAP CER SMD 0805 .22UF 10% X7R 5; Manufacturer: Yageo; Manufacturer Part Number: CC0805KKX7R9BB224; .PCBCHK: USED; .Creator: F:TALI; Washability: OK; Stock 1: 0; Pricing 1: 1=0.3, 10=0.207, 100=0.1048, 500=0.07168, 1000=0.06342 (USD); Mount: Surface Mount; Weight: 0.000194oz; Case Code (Imperial): 0805; Case Code (Metric): 2012; Min Operating Temperature: -55°C; Max Operating Temperature: 125°C; Capacitance: 220nF; Tolerance: 10%; Dielectric: X7R; Packaging: Tape and Reel; Voltage Rating (DC): 50V; Termination: SMD/SMT; Composition: Ceramic; Length: 2mm; Height: 1.25mm; Width: 0.049inch; Thickness: 0.057inch; Depth: 1.25mm; Radiation Hardening: No; Lead Free: Lead Free; Halogen Free: Halogen Free; ComponentLink1URL: https://www.verical.com/server-webapp/html/getDatasheet?partID=403679; ComponentLink1Description: https://www.verical.com/server-webapp/html/getDatasheet?partID=403679; ComponentLink2URL: http://www.mouser.com/ds/2/447/Yageo_UPY-GP_NP0_16V-to-50V_9-358835.pdf; ComponentLink2Description: http://www.mouser.com/ds/2/447/Yageo_UPY-GP_NP0_16V-to-50V_9-358835.pdf; Stock 2: 1266; Pricing 2: 1=0.24, 10=0.161, 100=0.0814, 500=0.0557, 1000=0.04928 (USD); Stock 3: 20000; Pricing 3: 1=0.26, 10=0.176, 100=0.0891, 500=0.061, 1000=0.05396 (USD); Contact Plating: Matte,Tin; Package Quantity: 2000; Features: Soft Termination; Ratings: AEC-Q200; ComponentLink3URL: https://www.avx.com/docs/Catalogs/flexiterm.pdf; ComponentLink3Description: https://www.avx.com/docs/Catalogs/flexiterm.pdf; .SCHCHK: USED; Supplier 1: Digi-Key; Supplier Part Number 1: 311-1887-6-ND
footprint C-0805
pins: 1, 2

## C-220NF-0805-100V
designator C?, comment 220NF  Voltage Rating: 100V  Case/Package: 0805
CAP CER 0.22UF 100V X7R 0805; Manufacturer: Samsung; Manufacturer Part Number: CL21B224KCFSFNE; Tolerance: 10%; Washability: OK; .Creator: M.OZKAN; .PCBCHK: USED; Supplier 1: Digi-Key; Supplier Part Number 1: 1276-2949-1-ND; Stock: 196761; Pricing: 1=0.24, 10=0.162, 100=0.0916, 500=0.0646, 1000=0.0566 (USD); RoHS: Yes; Mount: Surface Mount; Case Code (Metric): 2012; Case Code (Imperial): 0805; Min Operating Temperature: -55°C; Max Operating Temperature: 125°C; Dielectric: X7R; Package Quantity: 1; Packaging: Tape and Reel; Capacitance: 220nF; Length: 2mm; Height: 1.25mm; Thickness: 0.053inch; Depth: 1.25mm; Width: 0.049inch; Radiation Hardening: No; Lead Free: Lead Free; ComponentLink1URL: https://datasheet.ciiva.com/25732/cl21b224kcfsfne-25732742.pdf?src-supplier=Digi-Key; ComponentLink1Description: https://datasheet.ciiva.com/25732/cl21b224kcfsfne-25732742.pdf?src-supplier=Digi-Key; .SCHCHK: USED
footprint C-0805
pins: 1, 2

## C-220NF-1812
designator C?, comment 220NF  Case/Package: 1812  Voltage Rating: 100V